# Altium footprint library TranDangKhoa-LIB.PcbLib: 1435 footprints (part 82 of 90)
Each footprint in its own frame and in the unit in brackets; x right, y up, seen from the top. Pads: shape width x height; smd on the part's side, far side on the other; paste and mask are expansions set on the pad; w line width, h text height; cw(c..) or ccw(c..) is an arc to the next point about the centre after c.
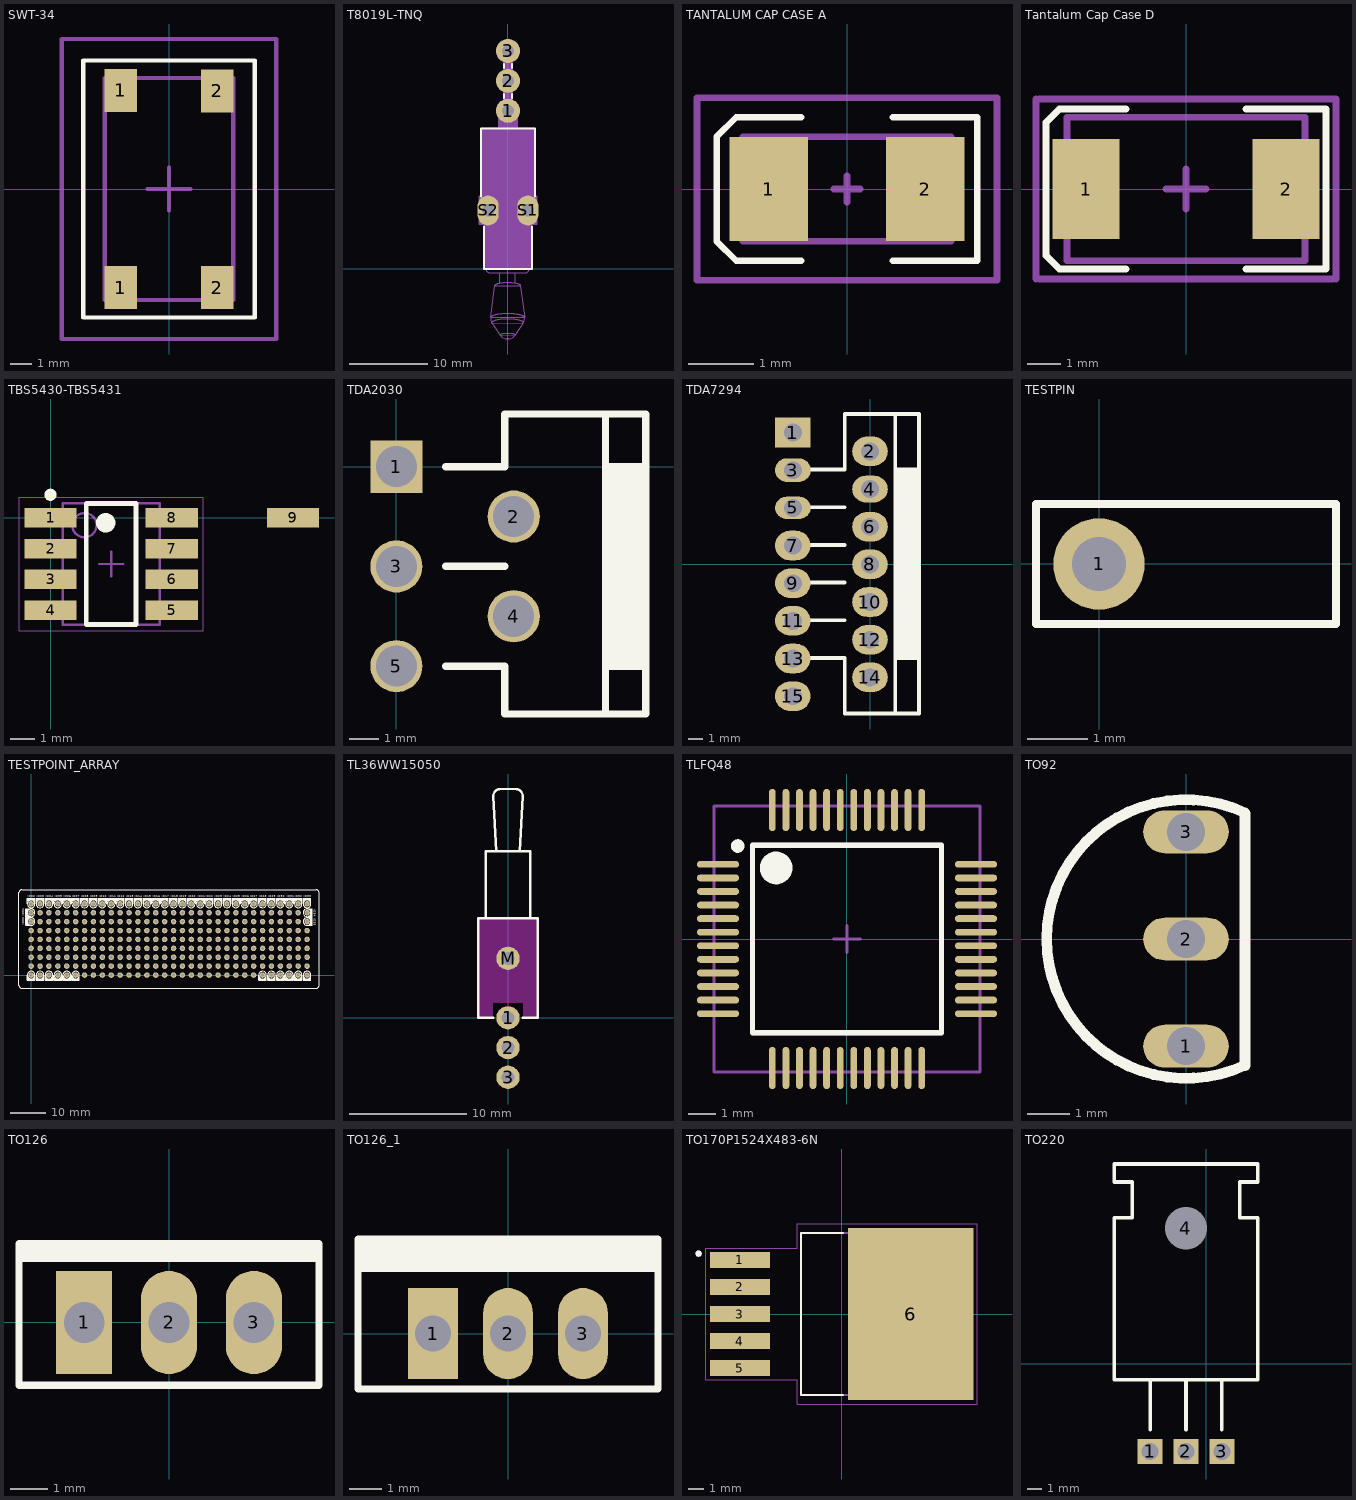
[diagram p81: the footprints below, top view; thin cyan lines are the x and y axes]

## SWT-34 [mm]
pads (4):
  rect 1.5x2 smd mask+0.01: 1(-2.25,-4.6) 1(-2.25,4.6) 2(2.25,-4.6) 2(2.25,4.575)
Top Overlay:
  lines w0.2: -4,-6 4,-6 4,6 -4,6 -4,-6
Mechanical 13:
  lines w0.2: -3,-5.177 3,-5.177 3,5.177 -3,5.177 -3,-5.177
Mechanical 15:
  lines w0.2: -1,0 0,0 ; 0,-1 0,0 ; 0,1 0,0 ; 1,0 0,0 ; 0,0 0,0 ; -5,-7 5,-7 5,7 -5,7 -5,-7
3D body "SWT-34.STEP": height 7.3, standoff -0.05, extent -3,-5.177 3,5.177

## T8019L-TNQ [mm]
pads (5):
  round 3.048 hole 1.5: 1(0,20.142) 2(0,23.952) 3(0,27.762)
  oval 2.7x3.81 hole 1.6: S1(2.54,7.442) S2(-2.54,7.442)
Top Overlay:
  lines w0.127: -2.8,0 2.7,0
  lines w0.254: -3.429,9.22 -3.429,17.907 3.429,17.907 3.429,9.22 ; -3.048,5.41 -3.048,0 3.048,0 3.048,5.41 3.073,5.41 ; -0.508,21.793 -0.508,22.301 ; -0.508,25.603 -0.508,26.111 ; 0.508,21.793 0.508,22.301 ; 0.508,25.603 0.508,26.111
Mechanical 7:
  drawing of 729 lines, arcs and shapes, not listed
3D body "SPDT Subminiature Toggle.stp": height 13, standoff -2.5, extent -3.5,-8.383 3.5,28.012

## TANTALUM CAP CASE A [mm]
pads (2):
  rect 1.2x1.6 smd mask+0.01: 1(-1.2,0) 2(1.2,0)
Top Overlay:
  lines w0.1: -0.7,-1.1 -1.7,-1.1 -2,-0.8 -2,0.8 -1.7,1.1 -0.7,1.1 ; 0.7,-1.1 2,-1.1 2,1.1 0.7,1.1
Mechanical 13:
  lines w0.1: -1.6,-0.8 -1.6,0.8 1.6,0.8 1.6,-0.8 -1.6,-0.8
Mechanical 15:
  lines w0.1: -0.2,0 0.2,0 ; 0,-0.2 0,0.2 ; -2.3,-1.4 2.3,-1.4 2.3,1.4 -2.3,1.4 -2.3,-1.4
3D body "Tantalum Cap Case A.STEP": height 1.6, standoff 0, extent -1.6,-0.8 1.6,0.8

## Tantalum Cap Case D [mm]
pads (2):
  rect 2x3 smd mask+0.01: 1(-3,0) 2(3,0)
Top Overlay:
  lines w0.2: -1.8,-2.4 -3.8,-2.4 -4.2,-2 -4.2,2 -3.8,2.4 -1.8,2.4 ; 1.8,-2.4 4.2,-2.4 4.2,2.4 1.8,2.4
Mechanical 13:
  lines w0.2: -3.57,-2.15 -3.57,2.15 3.57,2.15 3.57,-2.15 -3.57,-2.15
Mechanical 15:
  lines w0.2: -4.5,-2.7 -4.5,2.7 ; -4.4,-2.7 4.4,-2.7 ; -4.4,2.7 4.5,2.7 4.5,-2.7 ; -0.6,0 0.6,0 ; 0,-0.6 0,0.6
3D body "Tantalum Cap Case D.STEP": height 2.8, standoff 0, extent -3.57,-2.15 3.57,2.15

## TBS5430-TBS5431 [mm] "SOIC, 9-Leads, Body 5.00x4.00mm, Pitch 1.27mm, IPC Medium Density"
height 1.7
pads (9):
  rect 2.15x0.8 smd: 1(0,0) 2(0,-1.27) 3(0,-2.54) 4(0,-3.81) 5(5,-3.81) 6(5,-2.54) 7(5,-1.27) 8(5,0) 9(10,0)
Top Overlay:
  circle w0.25: c0,0.95 r0.125
  circle w0.4: c2.275,-0.205 r0.2
  lines w0.2: 1.475,-4.405 1.475,0.595 3.525,0.595 3.525,-4.405 1.475,-4.405
Mechanical 13:
  circle w0.1: c1.4,-0.305 r0.5
  lines w0.1: 0.5,-4.405 0.5,0.595 4.5,0.595 4.5,-4.405 0.5,-4.405
Mechanical 15:
  lines w0.05: -1.3,-4.655 -1.3,0.845 6.3,0.845 6.3,-4.655 -1.3,-4.655
  lines w0.1: 2,-1.905 3,-1.905 ; 2.5,-2.405 2.5,-1.405
3D body: height 1.7, standoff 1.7, extent 0.5,-4.405 4.5,0.595

## TDA2030 [mm]
pads (5):
  rect 1.778x1.778 hole 1.4 unplated: 1(0,0)
  round 1.778 hole 1.4 unplated: 2(4,-1.7) 3(0,-3.4) 4(4,-5.1) 5(0,-6.8)
Top Overlay:
  rectangle: 7.13,-6.807 8.5,0
  lines w0.254: 1.676,-6.8 3.7,-6.8 3.7,-8.433 8.5,-8.433 8.5,-3.404 8.5,1.796 3.7,1.796 3.7,0 1.676,0 ; 1.676,-3.4 3.7,-3.4 ; 7.13,-8.433 7.13,0 ; 7.13,-6.8 8.5,-6.8 ; 7.13,1.796 7.13,0 ; 8.5,0 7.13,0

## TDA7294 [mm]
pads (15):
  rect 2.4x2 hole 1.2: 1(-5.219,8.889)
  oval 2.4x2 hole 1.2: 2(-0.019,7.619) 6(-0.019,2.539) 7(-5.219,1.269) 8(-0.019,-0.001) 9(-5.219,-1.271) 10(-0.019,-2.541) 11(-5.219,-3.811) 12(-0.019,-5.081) 13(-5.219,-6.351) 14(-0.019,-7.621) 15(-5.219,-8.891)
  oval 2.4x1.6 hole 1.2: 3(-5.219,6.349)
  oval 2.4x1.8 hole 1.2: 4(-0.019,5.079)
  oval 2.4x1.5 hole 1.2: 5(-5.219,3.809)
Top Overlay:
  rectangle: 1.681,-6.26 3.281,6.389
  lines w0.254: -4.742,-6.311 -1.719,-6.311 ; -4.742,-3.771 -1.719,-3.771 ; -4.742,-1.231 -1.719,-1.231 ; -4.742,1.309 -1.719,1.309 ; -4.742,3.849 -1.719,3.849 ; -4.742,6.389 -1.719,6.389 -1.719,10.139 3.281,10.139 3.281,0.039 3.281,-10.061 -1.719,-10.061 -1.719,-6.311 ; -1.719,-7.682 -1.719,-6.311 ; 1.681,-10.061 1.681,8.625 1.681,10.139 ; 1.681,-6.311 3.281,-6.311 3.281,-8.241 ; 1.681,6.389 3.281,6.389

## TESTPIN [mil]
pads (1):
  round 60 hole 35.43: 1(0,0)
Top Overlay:
  lines w5: -41.34,-39.37 155.51,-39.37 155.51,39.37 -41.34,39.37 -41.34,-39.37

## TESTPOINT_ARRAY [mil]
pads (288):
  round 62 hole 35.43: 1(0,0) 2(100,0) 3(200,0) 4(300,0) 5(400,0) 6(500,0) 7(600,0) 8(700,0) 9(800,0) 10(900,0) 11(1000,0) 12(1100,0) 13(1200,0) 14(1300,0) 15(1400,0) 16(1500,0) 17(1600,0) 18(1700,0) 19(1800,0) 20(1900,0) 21(2000,0) 22(2100,0) 23(2200,0) 24(2300,0) 25(2400,0) 26(2500,0) 27(2600,0) 28(2700,0) 29(2800,0) 30(2900,0) 31(3000,0) 32(3100,0) A1(0,700) A2(100,700) A3(200,700) A4(300,700) A5(400,700) A6(500,700) A7(600,700) A8(700,700) A9(800,700) A10(900,700) A11(1000,700) A12(1100,700) A13(1200,700) A14(1300,700) A15(1400,700) A16(1500,700) A17(1600,700) A18(1700,700) A19(1800,700) A20(1900,700) A21(2000,700) A22(2100,700) A23(2200,700) A24(2300,700) A25(2400,700) A26(2500,700) A27(2600,700) A28(2700,700) A29(2800,700) A30(2900,700) A31(3000,700) A32(3100,700) B1(0,600) B2(100,600) B3(200,600) B4(300,600) B5(400,600) B6(500,600) B7(600,600) B8(700,600) B9(800,600) B10(900,600) B11(1000,600) B12(1100,600) B13(1200,600) B14(1300,600) B15(1400,600) B16(1500,600) B17(1600,600) B18(1700,600) B19(1800,600) B20(1900,600) B21(2000,600) B22(2100,600) B23(2200,600) B24(2300,600) B25(2400,600) B26(2500,600) B27(2600,600) B28(2700,600) B29(2800,600) B30(2900,600) B31(3000,600) B32(3100,600) C1(0,500) C2(100,500) C3(200,500) C4(300,500) C5(400,500) C6(500,500) C7(600,500) C8(700,500) C9(800,500) C10(900,500) C11(1000,500) C12(1100,500) C13(1200,500) C14(1300,500) C15(1400,500) C16(1500,500) C17(1600,500) C18(1700,500) C19(1800,500) C20(1900,500) C21(2000,500) C22(2100,500) C23(2200,500) C24(2300,500) C25(2400,500) C26(2500,500) C27(2600,500) C28(2700,500) C29(2800,500) C30(2900,500) C31(3000,500) C32(3100,500) D1(0,400) D2(100,400) D3(200,400) D4(300,400) D5(400,400) D6(500,400) D7(600,400) D8(700,400) D9(800,400) D10(900,400) D11(1000,400) D12(1100,400) D13(1200,400) D14(1300,400) D15(1400,400) D16(1500,400) D17(1600,400) D18(1700,400) D19(1800,400) D20(1900,400) D21(2000,400) D22(2100,400) D23(2200,400) D24(2300,400) D25(2400,400) D26(2500,400) D27(2600,400) D28(2700,400) D29(2800,400) D30(2900,400) D31(3000,400) D32(3100,400) E1(0,300) E2(100,300) E3(200,300) E4(300,300) E5(400,300) E6(500,300) E7(600,300) E8(700,300) E9(800,300) E10(900,300) E11(1000,300) E12(1100,300) E13(1200,300) E14(1300,300) E15(1400,300) E16(1500,300) E17(1600,300) E18(1700,300) E19(1800,300) E20(1900,300) E21(2000,300) E22(2100,300) E23(2200,300) E24(2300,300) E25(2400,300) E26(2500,300) E27(2600,300) E28(2700,300) E29(2800,300) E30(2900,300) E31(3000,300) E32(3100,300) F1(0,200) F2(100,200) F3(200,200) F4(300,200) F5(400,200) F6(500,200) F7(600,200) F8(700,200) F9(800,200) F10(900,200) F11(1000,200) F12(1100,200) F13(1200,200) F14(1300,200) F15(1400,200) F16(1500,200) F17(1600,200) F18(1700,200) F19(1800,200) F20(1900,200) F21(2000,200) F22(2100,200) F23(2200,200) F24(2300,200) F25(2400,200) F26(2500,200) F27(2600,200) F28(2700,200) F29(2800,200) F30(2900,200) F31(3000,200) F32(3100,200) G1(0,100) G2(100,100) G3(200,100) G4(300,100) G5(400,100) G6(500,100) G7(600,100) G8(700,100) G9(800,100) G10(900,100) G11(1000,100) G12(1100,100) G13(1200,100) G14(1300,100) G15(1400,100) G16(1500,100) G17(1600,100) G18(1700,100) G19(1800,100) G20(1900,100) G21(2000,100) G22(2100,100) G23(2200,100) G24(2300,100) G25(2400,100) G26(2500,100) G27(2600,100) G28(2700,100) G29(2800,100) G30(2900,100) G31(3000,100) G32(3100,100) H1(0,800) H2(100,800) H3(200,800) H4(300,800) H5(400,800) H6(500,800) H7(600,800) H8(700,800) H9(800,800) H10(900,800) H11(1000,800) H12(1100,800) H13(1200,800) H14(1300,800) H15(1400,800) H16(1500,800) H17(1600,800) H18(1700,800) H19(1800,800) H20(1900,800) H21(2000,800) H22(2100,800) H23(2200,800) H24(2300,800) H25(2400,800) H26(2500,800) H27(2600,800) H28(2700,800) H29(2800,800) H30(2900,800) H31(3000,800) H32(3100,800)
Top Overlay:
  drawing of 344 lines, arcs and shapes, not listed
  text "IO35" at 3175,635.9 h26
  text "IO34" at 3175,736.52 h26
  text "IO33" at 3064.1,875 h26
  text "IO32" at 2964.1,875 h26
  text "IO31" at 2869.67,875 h26
  text "IO30" at 2764.1,875 h26
  text "IO29" at 2664.72,875 h26
  text "IO28" at 2564.1,875 h26
  text "IO27" at 2464.1,875 h26
  text "IO26" at 2364.72,875 h26
  text "IO25" at 2264.1,875 h26
  text "IO24" at 2163.48,875 h26
  text "IO23" at 2064.1,875 h26
  text "IO22" at 1964.1,875 h26
  text "IO21" at 1869.67,875 h26
  text "IO20" at 1764.1,875 h26
  text "IO19" at 1666.76,875 h26
  text "IO18" at 1566.15,875 h26
  text "IO17" at 1466.15,875 h26
  text "IO16" at 1366.76,875 h26
  text "IO15" at 1266.15,875 h26
  text "IO14" at 1165.53,875 h26
  text "IO02" at -35.9,875 h26
  text "IO13" at 1066.15,875 h26
  text "IO12" at 966.15,875 h26
  text "IO11" at 871.72,875 h26
  text "IO10" at 766.15,875 h26
  text "IO09" at 664.72,875 h26
  text "IO08" at 564.1,875 h26
  text "IO07" at 464.1,875 h26
  text "IO03" at 64.1,875 h26
  text "IO06" at 364.72,875 h26
  text "IO35" at 264.1,875 h26
  text "IO04" at 163.48,875 h26
  text "IO01" at -75,664.72 h26
  text "IO00" at -75,564.1 h26

## TL36WW15050 [mm] "Vertical right angle SPDT switch"
height 8.636
pads (4):
  round 2 hole 1.1: 1(0,0) 2(0,-2.54) 3(0,-5.08) M(0,5.08)
Top Layer keep-out:
  rectangle: 1.27,0 2.54,1.27
  rectangle: -2.54,0 -1.27,1.27
  rectangle: -2.54,1.27 2.54,8.509
Top Overlay:
  lines w0.2: -1.905,8.509 -1.905,14.224 1.905,14.224 1.905,8.509 ; -1.27,0 -2.54,0 -2.54,8.509 2.54,8.509 2.54,0 1.27,0 ; -1.016,14.224 -1.27,18.923 cw(c-0.635,18.923) -0.635,19.558 0.635,19.558 cw(c0.635,18.923) 1.27,18.923 1.016,14.224

## TLFQ48 [mm] "48-Pin Thin Quad Flat Pack 0.5 mm Pitch, IPC High Density"
height 1.6
pads (48):
  oval 1.55x0.25 smd: 1(-4.75,2.75) 2(-4.75,2.25) 3(-4.75,1.75) 4(-4.75,1.25) 5(-4.75,0.75) 6(-4.75,0.25) 7(-4.75,-0.25) 8(-4.75,-0.75) 9(-4.75,-1.25) 10(-4.75,-1.75) 11(-4.75,-2.25) 12(-4.75,-2.75) 25(4.75,-2.75) 26(4.75,-2.25) 27(4.75,-1.75) 28(4.75,-1.25) 29(4.75,-0.75) 30(4.75,-0.25) 31(4.75,0.25) 32(4.75,0.75) 33(4.75,1.25) 34(4.75,1.75) 35(4.75,2.25) 36(4.75,2.75)
  oval 0.25x1.55 smd: 13(-2.75,-4.75) 14(-2.25,-4.75) 15(-1.75,-4.75) 16(-1.25,-4.75) 17(-0.75,-4.75) 18(-0.25,-4.75) 19(0.25,-4.75) 20(0.75,-4.75) 21(1.25,-4.75) 22(1.75,-4.75) 23(2.25,-4.75) 24(2.75,-4.75) 37(2.75,4.75) 38(2.25,4.75) 39(1.75,4.75) 40(1.25,4.75) 41(0.75,4.75) 42(0.25,4.75) 43(-0.25,4.75) 44(-0.75,4.75) 45(-1.25,4.75) 46(-1.75,4.75) 47(-2.25,4.75) 48(-2.75,4.75)
Top Overlay:
  circle w0.6: c-2.611,2.616 r0.3
  circle w0.25: c-4.025,3.425 r0.125
  lines w0.2: -3.48,-3.454 3.48,-3.454 3.48,3.454 -3.48,3.454 -3.48,-3.454
Mechanical 13:
  circle w0.1: c-2.6,2.6 r0.5
  lines w0.1: -3.5,-3.5 3.5,-3.5 3.5,3.5 -3.5,3.5 -3.5,-3.5
Mechanical 15:
  lines w0.1: -0.5,0 0.5,0 ; 0,-0.5 0,0.5 ; -4.9,-4.9 4.9,-4.9 4.9,4.9 -4.9,4.9 -4.9,-4.9
3D body: height 1.6, standoff 0, extent -3.5,-3.5 3.5,3.5

## TO92 [mil] "TO, Flat Index; 3 In-Line, Axial Leads; Body Dia. 4.8mm"
pads (3):
  oval 80x40 hole 35.43: 1(0,-100) 2(0,0) 3(0,100)
Top Overlay:
  lines w10: 54.92,-117.83 cw(c0,0) 54.92,117.83 ; 55,-118 55,117
3D body "SW3dPS-TO92.STEP": height 342.52, standoff -102.31, extent -100,-108.87 60.56,108.87

## TO126 [mil] "TO, Thru-Hole, Vertical, Heatsink Mounted; 3 In-Line Leads; Pitch 2.54 mm; Pin sequence 1, 3, 2"
height 645.67
pads (3):
  rect 60x110 hole 43.31: 1(-90.55,0)
  oval 60x110 hole 43.31: 2(0,0) 3(90.55,0)
Top Overlay:
  rectangle: -160,64.49 160,85
  lines w7.87: -160,-66.93 -160,84.17 160,84.17 160,-66.93 -160,-66.93
3D body "User Library-BD135 (TO-126,SOT32) v4.STEP": height 614.17, standoff -92.33, extent -153.54,-71.3 153.54,35

## TO126_1 [mil] "TO, Thru-Hole, Vertical, Heatsink Mounted; 3 In-Line Leads; Pitch 2.54 mm; Pin sequence 1, 3, 2"
height 645.67
pads (3):
  rect 60x110 hole 43.31: 1(-90.55,0)
  oval 60x110 hole 43.31: 2(0,0) 3(90.55,0)
Top Overlay:
  rectangle: -181.1,74.49 181.1,114.17
  lines w7.87: -181.1,-66.93 -181.1,114.17 181.1,114.17 181.1,-66.93 -181.1,-66.93

## TO170P1524X483-6N [mm]
height 4.83
pads (6):
  rect 3.79x0.99 smd: 1(-6.4,3.4) 2(-6.4,1.7) 3(-6.4,0) 4(-6.4,-1.7) 5(-6.4,-3.4)
  rect 7.88x10.84 smd paste-6: 6(4.35,0)
Top Overlay:
  circle w0.2: c-9,3.8 r0.1
  lines w0.127: 0.09,-5.08 -2.553,-5.08 -2.553,5.08 0.09,5.08
Top Paste:
  region: 7.74,-5.15 6.22,-5.15 6.22,-3.9 7.74,-3.9
  region: 2.48,-5.15 0.96,-5.15 0.96,-3.9 2.48,-3.9
  region: 5.11,-5.15 3.59,-5.15 3.59,-3.9 5.11,-3.9
  region: 7.74,-3.34 6.22,-3.34 6.22,-2.09 7.74,-2.09
  region: 2.48,-3.34 0.96,-3.34 0.96,-2.09 2.48,-2.09
  region: 5.11,-3.34 3.59,-3.34 3.59,-2.09 5.11,-2.09
  region: 7.74,-1.53 6.22,-1.53 6.22,-0.28 7.74,-0.28
  region: 2.48,-1.53 0.96,-1.53 0.96,-0.28 2.48,-0.28
  region: 5.11,-1.53 3.59,-1.53 3.59,-0.28 5.11,-0.28
  region: 7.74,3.9 6.22,3.9 6.22,5.15 7.74,5.15
  region: 2.48,3.9 0.96,3.9 0.96,5.15 2.48,5.15
  region: 5.11,3.9 3.59,3.9 3.59,5.15 5.11,5.15
  region: 7.74,2.09 6.22,2.09 6.22,3.34 7.74,3.34
  region: 2.48,2.09 0.96,2.09 0.96,3.34 2.48,3.34
  region: 5.11,2.09 3.59,2.09 3.59,3.34 5.11,3.34
  region: 7.74,0.28 6.22,0.28 6.22,1.53 7.74,1.53
  region: 2.48,0.28 0.96,0.28 0.96,1.53 2.48,1.53
  region: 5.11,0.28 3.59,0.28 3.59,1.53 5.11,1.53
Mechanical 13:
  circle w0.2: c-9,3.8 r0.1
  lines w0.127: -2.553,-5.08 -2.553,5.08 6.368,5.08 6.368,-5.08 -2.553,-5.08
Mechanical 15:
  lines w0.05: -8.545,-4.145 -2.803,-4.145 -2.803,-5.67 8.54,-5.67 8.54,5.67 -2.803,5.67 -2.803,4.145 -8.545,4.145 -8.545,-4.145
3D body "step_temp.STEP": height 4.65, standoff -0.15, extent -7.175,-5.08 7.175,5.08

## TO220 [mm]
pads (4):
  rect 1.778x1.778 hole 1.2 unplated: 1(-3.958,-6.21) 2(-1.418,-6.21) 3(1.122,-6.21)
  round 1.778 hole 3 unplated: 4(-1.418,9.57)
Top Overlay:
  lines w0.254: -3.958,-4.686 -3.958,-1.13 ; -1.418,-4.686 -1.418,-1.13 ; 1.122,-4.686 1.122,-1.13 ; -6.498,-1.13 3.662,-1.13 3.662,10.3 2.392,10.3 2.392,12.84 3.662,12.84 3.662,14.11 -6.498,14.11 -6.498,12.84 -5.228,12.84 -5.228,10.3 -6.498,10.3 -6.498,-1.13